# Altium footprint library 1MaxPcb.PcbLib: 187 footprints (part 2 of 12)
Each footprint in its own frame and in the unit in brackets; x right, y up, seen from the top. Pads: shape width x height; smd on the part's side, far side on the other; paste and mask are expansions set on the pad; w line width, h text height; cw(c..) or ccw(c..) is an arc to the next point about the centre after c.
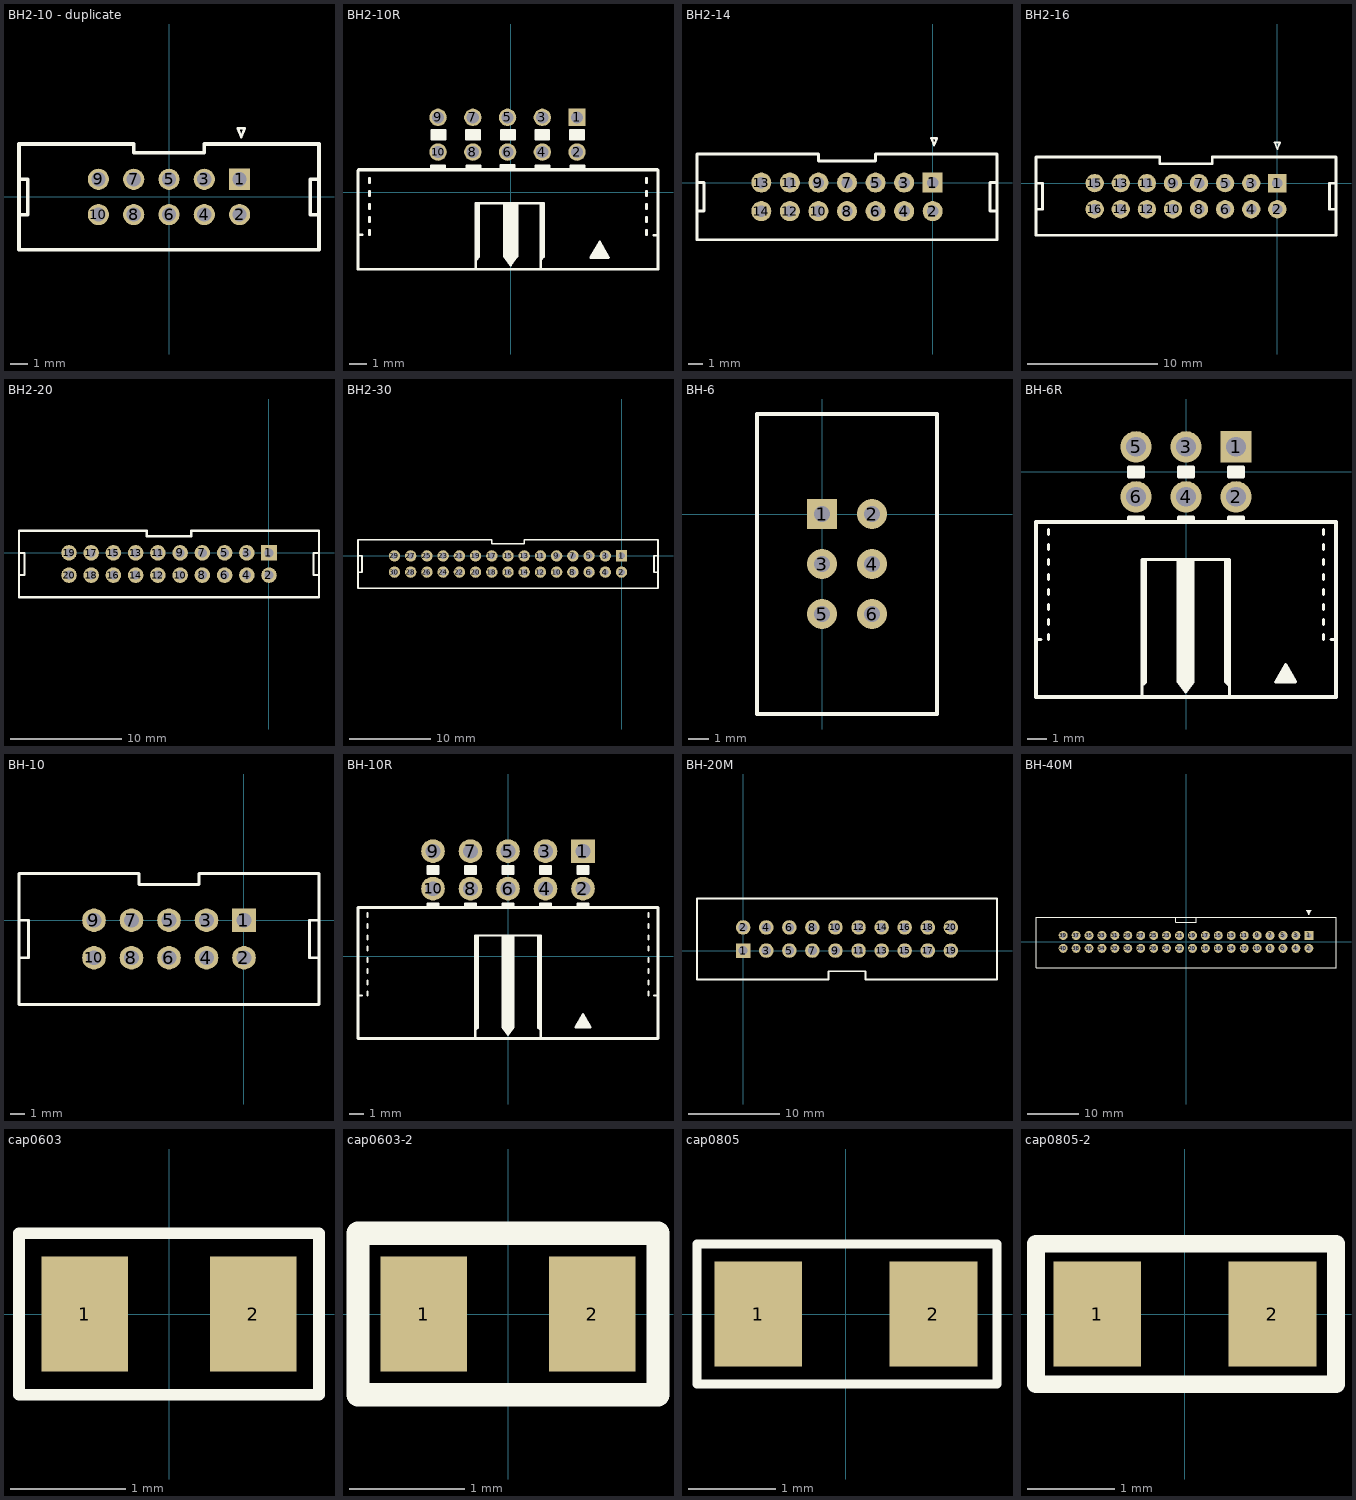
[diagram p1: the footprints below, top view; thin cyan lines are the x and y axes]

## BH2-10 - duplicate [mm]
pads (10):
  rect 1.2x1.2 hole 0.8: 1(4,1)
  round 1.2 hole 0.8: 2(4,-1) 3(2,1) 4(2,-1) 5(0,1) 6(0,-1) 7(-2,1) 8(-2,-1) 9(-4,1) 10(-4,-1)
Top Overlay:
  lines w0.15: 3.9,3.9 4.3,3.9 4.1,3.4 3.9,3.9
  lines w0.2: -8.5,-1 -8,-1 -8,1 -8.5,1 ; 8.5,-1 8,-1 8,1 8.5,1 ; -8.5,-3 8.5,-3 8.5,3 2,3 2,2.5 -2,2.5 -2,3 -8.5,3 -8.5,-3

## BH2-10R [mm]
height 6
pads (10):
  rect 1x1 hole 0.7: 1(3.81,4.318)
  round 1 hole 0.7: 2(3.81,2.318) 3(1.81,4.318) 4(1.81,2.318) 5(-0.19,4.318) 6(-0.19,2.318) 7(-2.19,4.318) 8(-2.19,2.318) 9(-4.19,4.318) 10(-4.19,2.318)
Top Overlay:
  region: 5.623,-3.75 5.115,-2.861 4.607,-3.75
  lines w0.15: -8.8,-4.432 -8.8,1.258 ; -8.8,-2.441 -8.546,-2.441 ; -8.79,-4.432 0.085,-4.432 ; -8.14,-2.432 -8.14,-2.178 ; -8.14,-1.686 -8.14,-1.432 ; -8.14,-0.936 -8.14,-0.682 ; -8.14,-0.186 -8.14,0.068 ; -8.14,0.564 -8.14,0.818 ; -4.576,1.278 -4.576,1.532 -3.814,1.532 -3.814,1.278 ; -4.449,1.278 -4.449,1.532 ; -4.424,3.064 -4.424,3.572 ; -4.322,1.278 -4.322,1.532 ; -4.297,3.064 -4.297,3.572 ; -4.195,1.278 -4.195,1.532 ; -4.17,3.064 -4.17,3.572 ; -4.068,1.278 -4.068,1.532 ; -4.043,3.064 -4.043,3.572 ; -3.941,1.278 -3.941,1.532 ; -3.916,3.064 -3.916,3.572 ; -2.536,1.278 -2.536,1.532 -1.774,1.532 -1.774,1.278 ; -2.434,3.064 -2.434,3.572 ; -2.409,1.278 -2.409,1.532 ; -2.307,3.064 -2.307,3.572 ; -2.282,1.278 -2.282,1.532 ; -2.18,3.064 -2.18,3.572 ; -2.155,1.278 -2.155,1.532 ; -2.053,3.064 -2.053,3.572 ; -2.028,1.278 -2.028,1.532 ; -2.015,-0.627 1.885,-0.627 ; -2.013,-4.432 -2.013,-0.652 -1.94,-0.725 -1.94,-3.707 ; -1.99,-3.857 -1.84,-3.707 -1.84,-0.652 ; -1.926,3.064 -1.926,3.572 ; -1.901,1.278 -1.901,1.532 ; -0.571,1.303 -0.571,1.557 0.191,1.557 0.191,1.303 ; -0.444,1.303 -0.444,1.557 ; -0.419,3.064 -0.419,3.572 ; -0.39,-0.657 -0.39,-3.683 -0.015,-4.183 ; -0.317,1.303 -0.317,1.557 ; -0.292,3.064 -0.292,3.572 ; -0.268,-3.832 -0.265,-0.657 ; -0.19,1.303 -0.19,1.557 ; -0.165,3.064 -0.165,3.572 ; -0.142,-3.929 -0.142,-0.657 ; -0.063,1.303 -0.063,1.557 ; -0.038,3.064 -0.038,3.572 ; -0.015,-4.432 8.46,-4.432 ; -0.015,-0.657 -0.015,-4.183 ; 0.064,1.303 0.064,1.557 ; 0.089,3.064 0.089,3.572 ; 0.112,-3.929 0.112,-0.657 ; 0.239,-3.802 0.239,-0.657 ; 0.36,-0.657 0.36,-3.683 -0.015,-4.183 ; 1.444,1.278 1.444,1.532 2.206,1.532 2.206,1.278 ; 1.556,3.064 1.556,3.572 ; 1.571,1.278 1.571,1.532 ; 1.683,3.064 1.683,3.572 ; 1.698,1.278 1.698,1.532 ; 1.713,-4.432 1.713,-0.652 1.785,-0.724 1.785,-3.707 ; 1.735,-3.857 1.885,-3.707 1.885,-0.652 ; 1.81,3.064 1.81,3.572 ; 1.825,1.278 1.825,1.532 ; 1.937,3.064 1.937,3.572 ; 1.952,1.278 1.952,1.532 ; 2.064,3.064 2.064,3.572 ; 2.079,1.278 2.079,1.532 ; 3.459,1.278 3.459,1.532 4.221,1.532 4.221,1.278 ; 3.556,3.064 3.556,3.572 ; 3.586,1.278 3.586,1.532 ; 3.683,3.064 3.683,3.572 ; 3.713,1.278 3.713,1.532 ; 3.81,3.064 3.81,3.572 ; 3.84,1.278 3.84,1.532 ; 3.937,3.064 3.937,3.572 ; 3.967,1.278 3.967,1.532 ; 4.064,3.064 4.064,3.572 ; 4.094,1.278 4.094,1.532 ; 7.81,-2.432 7.81,-2.178 ; 7.81,-1.686 7.81,-1.432 ; 7.81,-0.936 7.81,-0.682 ; 7.81,-0.186 7.81,0.068 ; 7.81,0.564 7.81,0.818 ; 8.216,-2.466 8.47,-2.466 ; 8.47,-4.432 8.47,1.278 ; -4.551,3.064 -3.789,3.064 -3.789,3.572 -4.551,3.572 -4.551,3.064 ; -2.561,3.064 -2.561,3.572 -1.799,3.572 -1.799,3.064 -2.561,3.064 ; -0.546,3.064 0.216,3.064 0.216,3.572 -0.546,3.572 -0.546,3.064 ; 1.429,3.064 1.429,3.572 2.191,3.572 2.191,3.064 1.429,3.064 ; 3.429,3.064 3.429,3.572 4.191,3.572 4.191,3.064 3.429,3.064 ; 4.607,-3.75 5.623,-3.75 5.115,-2.861 4.607,-3.75
  lines w0.2: -8.765,1.293 8.435,1.293

## BH2-14 [mm]
pads (14):
  rect 1.4x1.4 hole 0.8: 1(0,0)
  round 1.4 hole 0.8: 2(0,-2) 3(-2,0) 4(-2,-2) 5(-4,0) 6(-4,-2) 7(-6,0) 8(-6,-2) 9(-8,0) 10(-8,-2) 11(-10,0) 12(-10,-2) 13(-12,0) 14(-12,-2)
Top Overlay:
  lines w0.15: -0.1,3.1 0.1,2.6 0.3,3.1 -0.1,3.1
  lines w0.2: -16.5,-2 -16,-2 -16,0 -16.5,0 ; 4.5,-2 4,-2 4,0 4.5,0 ; -16.5,-4 4.5,-4 4.5,2 -4,2 -4,1.5 -8,1.5 -8,2 -16.5,2 -16.5,-4

## BH2-16 [mm]
pads (16):
  rect 1.4x1.4 hole 0.8: 1(0,0)
  round 1.4 hole 0.8: 2(0,-2) 3(-2,0) 4(-2,-2) 5(-4,0) 6(-4,-2) 7(-6,0) 8(-6,-2) 9(-8,0) 10(-8,-2) 11(-10,0) 12(-10,-2) 13(-12,0) 14(-12,-2) 15(-14,0) 16(-14,-2)
Top Overlay:
  lines w0.15: -0.2,3.1 0.2,3.1 0,2.6 -0.2,3.1
  lines w0.2: -18.5,-2 -18,-2 -18,0 -18.5,0 ; 4.5,-2 4,-2 4,0 4.5,0 ; -18.5,-4 -18.5,2 -9,2 -9,1.5 -5,1.5 -5,2 4.5,2 4.5,-4 -18.5,-4

## BH2-20 [mm]
pads (20):
  rect 1.4x1.4 hole 0.8: 1(0,0)
  round 1.4 hole 0.8: 2(0,-2) 3(-2,0) 4(-2,-2) 5(-4,0) 6(-4,-2) 7(-6,0) 8(-6,-2) 9(-8,0) 10(-8,-2) 11(-10,0) 12(-10,-2) 13(-12,0) 14(-12,-2) 15(-14,0) 16(-14,-2) 17(-16,0) 18(-16,-2) 19(-18,0) 20(-18,-2)
Top Overlay:
  lines w0.2: -22.5,-2 -22,-2 -22,0 -22.5,0 ; 4.5,-2 4,-2 4,0 4.5,0 ; -22.5,-4 4.5,-4 4.5,2 -7,2 -7,1.5 -11,1.5 -11,2 -22.5,2 -22.5,-4
Internal Plane 5:
  lines w0.178: -22.5,-2 -22,-2 -22,0 -22.5,0 ; 4.5,-2 4,-2 4,0 4.5,0 ; -22.5,-4 4.5,-4 4.5,2 -7,2 -7,1.5 -11,1.5 -11,2 -22.5,2 -22.5,-4
3D body "BH2-20.step": height 5.65, standoff -3.6, extent -22.5,-3.725 4.5,1.725

## BH2-30 [mm]
pads (30):
  rect 1.4x1.4 hole 0.8: 1(0,0)
  round 1.4 hole 0.8: 2(0,-2) 3(-2,0) 4(-2,-2) 5(-4,0) 6(-4,-2) 7(-6,0) 8(-6,-2) 9(-8,0) 10(-8,-2) 11(-10,0) 12(-10,-2) 13(-12,0) 14(-12,-2) 15(-14,0) 16(-14,-2) 17(-16,0) 18(-16,-2) 19(-18,0) 20(-18,-2) 21(-20,0) 22(-20,-2) 23(-22,0) 24(-22,-2) 25(-24,0) 26(-24,-2) 27(-26,0) 28(-26,-2) 29(-28,0) 30(-28,-2)
Top Overlay:
  lines w0.2: -32.5,-2 -32,-2 -32,0 -32.5,0 ; 4.5,-2 4,-2 4,0 4.5,0 ; -32.5,-4 4.5,-4 4.5,2 -12,2 -12,1.5 -16,1.5 -16,2 -32.5,2 -32.5,-4

## BH-6 [mm]
pads (6):
  rect 1.5x1.5 hole 0.8: 1(0,0)
  round 1.5 hole 0.8: 2(2.5,0) 3(0,-2.5) 4(2.5,-2.5) 5(0,-5) 6(2.5,-5)
Top Overlay:
  lines w0.2: -3.25,-10 5.75,-10 5.75,3.75 5.75,5 4.5,5 1.25,5 -3.25,5 -3.25,-10

## BH-6R [mm]
height 9
pads (6):
  rect 1.6x1.6 hole 1: 1(2.54,1.27)
  round 1.6 hole 1: 2(2.54,-1.27) 3(0,1.27) 4(0,-1.27) 5(-2.54,1.27) 6(-2.54,-1.27)
Top Overlay:
  region: 5.573,-10.668 5.065,-9.779 4.557,-10.668
  lines w0.15: -7.62,-8.509 -7.366,-8.509 ; -6.985,-8.509 -6.985,-8.255 ; -6.985,-7.747 -6.985,-7.493 ; -6.985,-6.985 -6.985,-6.731 ; -6.985,-6.223 -6.985,-5.969 ; -6.985,-5.461 -6.985,-5.207 ; -6.985,-4.699 -6.985,-4.445 ; -6.985,-3.937 -6.985,-3.683 ; -6.985,-3.175 -6.985,-2.921 ; -2.921,-2.54 -2.921,-2.286 -2.159,-2.286 -2.159,-2.54 ; -2.794,-2.54 -2.794,-2.286 ; -2.794,-0.254 -2.794,0.254 ; -2.667,-2.54 -2.667,-2.286 ; -2.667,-0.254 -2.667,0.254 ; -2.54,-2.54 -2.54,-2.286 ; -2.54,-0.254 -2.54,0.254 ; -2.413,-2.54 -2.413,-2.286 ; -2.413,-0.254 -2.413,0.254 ; -2.286,-2.54 -2.286,-2.286 ; -2.286,-0.254 -2.286,0.254 ; -2.238,-11.43 -2.238,-4.445 2.207,-4.445 2.207,-11.43 ; -2.174,-10.795 -2.047,-10.668 -2.047,-4.445 ; -2.174,-10.668 -2.174,-4.445 ; -0.396,-4.445 -0.396,-10.668 -0.015,-11.176 ; -0.381,-2.54 -0.381,-2.286 0.381,-2.286 0.381,-2.54 ; -0.269,-10.795 -0.269,-4.445 ; -0.254,-2.54 -0.254,-2.286 ; -0.254,-0.254 -0.254,0.254 ; -0.142,-10.922 -0.142,-4.445 ; -0.127,-2.54 -0.127,-2.286 ; -0.127,-0.254 -0.127,0.254 ; -0.015,-4.445 -0.015,-11.176 ; 0,-2.54 0,-2.286 ; 0,-0.254 0,0.254 ; 0.112,-10.922 0.112,-4.445 ; 0.127,-2.54 0.127,-2.286 ; 0.127,-0.254 0.127,0.254 ; 0.239,-10.795 0.239,-4.445 ; 0.254,-2.54 0.254,-2.286 ; 0.254,-0.254 0.254,0.254 ; 0.366,-4.445 0.366,-10.668 -0.015,-11.176 ; 2.017,-4.445 2.017,-10.668 2.144,-10.795 ; 2.144,-10.668 2.144,-4.445 ; 2.159,-2.54 2.159,-2.286 2.921,-2.286 2.921,-2.54 ; 2.286,-2.54 2.286,-2.286 ; 2.286,-0.254 2.286,0.254 ; 2.413,-2.54 2.413,-2.286 ; 2.413,-0.254 2.413,0.254 ; 2.54,-2.54 2.54,-2.286 ; 2.54,-0.254 2.54,0.254 ; 2.667,-2.54 2.667,-2.286 ; 2.667,-0.254 2.667,0.254 ; 2.794,-2.54 2.794,-2.286 ; 2.794,-0.254 2.794,0.254 ; 6.985,-8.509 6.985,-8.255 ; 6.985,-7.747 6.985,-7.493 ; 6.985,-6.985 6.985,-6.731 ; 6.985,-6.223 6.985,-5.969 ; 6.985,-5.461 6.985,-5.207 ; 6.985,-4.699 6.985,-4.445 ; 6.985,-3.937 6.985,-3.683 ; 6.985,-3.175 6.985,-2.921 ; 7.366,-8.509 7.62,-8.509 ; -2.921,-0.254 -2.921,0.254 -2.159,0.254 -2.159,-0.254 -2.921,-0.254 ; -0.381,-0.254 0.381,-0.254 0.381,0.254 -0.381,0.254 -0.381,-0.254 ; 2.159,-0.254 2.921,-0.254 2.921,0.254 2.159,0.254 2.159,-0.254 ; 4.557,-10.668 5.573,-10.668 5.065,-9.779 4.557,-10.668
  lines w0.2: -7.62,-11.43 -7.62,-2.54 7.62,-2.54 7.62,-11.43 2.207,-11.43 -2.238,-11.43 -7.62,-11.43
3D body "BH-6R.step": height 8.98, standoff -2.37, extent -7.935,-11.48 7.925,2.08

## BH-10 [mm]
height 9
pads (10):
  rect 1.6x1.6 hole 1: 1(0,0)
  round 1.6 hole 1: 2(0,-2.54) 3(-2.54,0) 4(-2.54,-2.54) 5(-5.08,0) 6(-5.08,-2.54) 7(-7.62,0) 8(-7.62,-2.54) 9(-10.16,0) 10(-10.16,-2.54)
Top Overlay:
  lines w0.2: -15.24,-2.54 -14.605,-2.54 -14.605,0 -15.24,0 ; 5.08,-2.54 4.445,-2.54 4.445,0 5.08,0 ; -15.24,-5.715 5.08,-5.715 5.08,3.175 -3.048,3.175 -3.048,2.413 -7.112,2.413 -7.112,3.175 -15.24,3.175 -15.24,-5.715
3D body "User Library-BH-10.STEP": height 9.2, standoff -2.9, extent -15.33,-6.02 5.17,3.28

## BH-10R [mm]
height 9
pads (10):
  rect 1.6x1.6 hole 1: 1(5.08,7.112)
  round 1.6 hole 1: 2(5.08,4.572) 3(2.54,7.112) 4(2.54,4.572) 5(0,7.112) 6(0,4.572) 7(-2.54,7.112) 8(-2.54,4.572) 9(-5.08,7.112) 10(-5.08,4.572)
Top Overlay:
  region: 5.588,-4.826 5.08,-3.937 4.572,-4.826
  lines w0.15: -10.16,-2.667 -9.906,-2.667 ; -9.525,-2.667 -9.525,-2.413 ; -9.525,-1.905 -9.525,-1.651 ; -9.525,-1.143 -9.525,-0.889 ; -9.525,-0.381 -9.525,-0.127 ; -9.525,0.381 -9.525,0.635 ; -9.525,1.143 -9.525,1.397 ; -9.525,1.905 -9.525,2.159 ; -9.525,2.667 -9.525,2.921 ; -5.461,3.302 -5.461,3.556 -4.699,3.556 -4.699,3.302 ; -5.334,3.302 -5.334,3.556 ; -5.334,5.588 -5.334,6.096 ; -5.207,3.302 -5.207,3.556 ; -5.207,5.588 -5.207,6.096 ; -5.08,3.302 -5.08,3.556 ; -5.08,5.588 -5.08,6.096 ; -4.953,3.302 -4.953,3.556 ; -4.953,5.588 -4.953,6.096 ; -4.826,3.302 -4.826,3.556 ; -4.826,5.588 -4.826,6.096 ; -2.921,3.302 -2.921,3.556 -2.159,3.556 -2.159,3.302 ; -2.794,3.302 -2.794,3.556 ; -2.794,5.588 -2.794,6.096 ; -2.667,3.302 -2.667,3.556 ; -2.667,5.588 -2.667,6.096 ; -2.54,3.302 -2.54,3.556 ; -2.54,5.588 -2.54,6.096 ; -2.413,3.302 -2.413,3.556 ; -2.413,5.588 -2.413,6.096 ; -2.286,3.302 -2.286,3.556 ; -2.286,5.588 -2.286,6.096 ; -2.222,-5.588 -2.222,1.397 2.222,1.397 2.222,-5.588 ; -2.159,-4.953 -2.032,-4.826 -2.032,1.397 ; -2.159,-4.826 -2.159,1.397 ; -0.381,1.397 -0.381,-4.826 0,-5.334 ; -0.381,3.302 -0.381,3.556 0.381,3.556 0.381,3.302 ; -0.254,-4.953 -0.254,1.397 ; -0.254,3.302 -0.254,3.556 ; -0.254,5.588 -0.254,6.096 ; -0.127,-5.08 -0.127,1.397 ; -0.127,3.302 -0.127,3.556 ; -0.127,5.588 -0.127,6.096 ; 0,1.397 0,-5.334 ; 0,3.302 0,3.556 ; 0,5.588 0,6.096 ; 0.127,-5.08 0.127,1.397 ; 0.127,3.302 0.127,3.556 ; 0.127,5.588 0.127,6.096 ; 0.254,-4.953 0.254,1.397 ; 0.254,3.302 0.254,3.556 ; 0.254,5.588 0.254,6.096 ; 0.381,1.397 0.381,-4.826 0,-5.334 ; 2.032,1.397 2.032,-4.826 2.159,-4.953 ; 2.159,-4.826 2.159,1.397 ; 2.159,3.302 2.159,3.556 2.921,3.556 2.921,3.302 ; 2.286,3.302 2.286,3.556 ; 2.286,5.588 2.286,6.096 ; 2.413,3.302 2.413,3.556 ; 2.413,5.588 2.413,6.096 ; 2.54,3.302 2.54,3.556 ; 2.54,5.588 2.54,6.096 ; 2.667,3.302 2.667,3.556 ; 2.667,5.588 2.667,6.096 ; 2.794,3.302 2.794,3.556 ; 2.794,5.588 2.794,6.096 ; 4.699,3.302 4.699,3.556 5.461,3.556 5.461,3.302 ; 4.826,3.302 4.826,3.556 ; 4.826,5.588 4.826,6.096 ; 4.953,3.302 4.953,3.556 ; 4.953,5.588 4.953,6.096 ; 5.08,3.302 5.08,3.556 ; 5.08,5.588 5.08,6.096 ; 5.207,3.302 5.207,3.556 ; 5.207,5.588 5.207,6.096 ; 5.334,3.302 5.334,3.556 ; 5.334,5.588 5.334,6.096 ; 9.525,-2.667 9.525,-2.413 ; 9.525,-1.905 9.525,-1.651 ; 9.525,-1.143 9.525,-0.889 ; 9.525,-0.381 9.525,-0.127 ; 9.525,0.381 9.525,0.635 ; 9.525,1.143 9.525,1.397 ; 9.525,1.905 9.525,2.159 ; 9.525,2.667 9.525,2.921 ; 9.906,-2.667 10.16,-2.667 ; -5.461,5.588 -4.699,5.588 -4.699,6.096 -5.461,6.096 -5.461,5.588 ; -2.921,5.588 -2.159,5.588 -2.159,6.096 -2.921,6.096 -2.921,5.588 ; -0.381,5.588 -0.381,6.096 0.381,6.096 0.381,5.588 -0.381,5.588 ; 2.159,5.588 2.921,5.588 2.921,6.096 2.159,6.096 2.159,5.588 ; 4.572,-4.826 5.588,-4.826 5.08,-3.937 4.572,-4.826 ; 4.699,5.588 5.461,5.588 5.461,6.096 4.699,6.096 4.699,5.588
  lines w0.2: -10.16,-5.588 -10.16,3.302 10.16,3.302 10.16,-5.588 2.222,-5.588 -2.222,-5.588 -10.16,-5.588
3D body "BH-10R.step": height 6.98, standoff -4.37, extent -10.37,-6.1 10.57,7.46

## BH-20M [mm] "Contact spacing 2,54 mm"
height 9
pads (20):
  rect 1.6x1.6 hole 1: 1(0,0)
  round 1.6 hole 1: 2(0,2.54) 3(2.54,0) 4(2.54,2.54) 5(5.08,0) 6(5.08,2.54) 7(7.62,0) 8(7.62,2.54) 9(10.16,0) 10(10.16,2.54) 11(12.7,0) 12(12.7,2.54) 13(15.24,0) 14(15.24,2.54) 15(17.78,0) 16(17.78,2.54) 17(20.32,0) 18(20.32,2.54) 19(22.86,0) 20(22.86,2.54)
Top Overlay:
  lines w0.2: -5.08,-3.175 9.398,-3.175 9.398,-2.286 13.462,-2.286 13.462,-3.175 27.94,-3.175 27.94,5.715 -5.08,5.715 -5.08,-3.175
3D body "User Library-BH-20.step": height 9.2, standoff -2.9, extent -5.17,-3.28 28.03,6.02

## BH-40M [mm]
pads (40):
  rect 1.75x1.75 hole 1: 1(24.13,1.27)
  round 1.75 hole 1: 2(24.13,-1.27) 3(21.59,1.27) 4(21.59,-1.27) 5(19.05,1.27) 6(19.05,-1.27) 7(16.51,1.27) 8(16.51,-1.27) 9(13.97,1.27) 10(13.97,-1.27) 11(11.43,1.27) 12(11.43,-1.27) 13(8.89,1.27) 14(8.89,-1.27) 15(6.35,1.27) 16(6.35,-1.27) 17(3.81,1.27) 18(3.81,-1.27) 19(1.27,1.27) 20(1.27,-1.27) 21(-1.27,1.27) 22(-1.27,-1.27) 23(-3.81,1.27) 24(-3.81,-1.27) 25(-6.35,1.27) 26(-6.35,-1.27) 27(-8.89,1.27) 28(-8.89,-1.27) 29(-11.43,1.27) 30(-11.43,-1.27) 31(-13.97,1.27) 32(-13.97,-1.27) 33(-16.51,1.27) 34(-16.51,-1.27) 35(-19.05,1.27) 36(-19.05,-1.27) 37(-21.59,1.27) 38(-21.59,-1.27) 39(-24.13,1.27) 40(-24.13,-1.27)
Top Overlay:
  region: 23.622,6.223 24.13,5.334 24.638,6.223
  lines w0.15: 23.622,6.223 24.13,5.334 24.638,6.223 23.622,6.223
  lines w0.2: -2.032,4.826 -2.032,3.826 2.032,3.826 2.032,4.826 ; -29.464,-5.08 29.464,-5.08 29.464,4.826 -29.464,4.826 -29.464,-5.08
3D body "BH-40.STEP": height 9.2, standoff -2.9, extent -29.3,-4.728 29.3,4.572

## cap0603 [mm]
height 0.45
pads (2):
  rect 0.75x1 smd mask+0.03: 1(-0.73,0) 2(0.73,0)
Top Overlay:
  lines w0.1: -1.3,-0.7 -1.3,0.7 1.3,0.7 1.3,-0.7 -1.3,-0.7
3D body "cap0603.STEP": height 0.8, standoff 0, extent -0.8,-0.4 0.8,0.4

## cap0603-2 [mm]
height 0.45
pads (2):
  rect 0.75x1 smd mask+0.03: 1(-0.73,0) 2(0.73,0)
Top Overlay:
  lines w0.2: -1.3,-0.7 -1.3,0.7 1.3,0.7 1.3,-0.7 -1.3,-0.7
3D body "cap0603.STEP": height 0.8, standoff 0, extent -0.8,-0.4 0.8,0.4

## cap0805 [mm]
height 0.5
pads (2):
  rect 1x1.2 smd mask+0.03: 1(-1,0) 2(1,0)
Top Overlay:
  lines w0.1: -1.7,-0.8 1.725,-0.8 1.725,0.8 -1.7,0.8 -1.7,-0.8
3D body "cap0805.STEP": height 0.6, standoff 0, extent -1,-0.625 1,0.625

## cap0805-2 [mm]
height 0.5
pads (2):
  rect 1x1.2 smd mask+0.03: 1(-1,0) 2(1,0)
Top Overlay:
  lines w0.2: -1.7,-0.8 1.725,-0.8 1.725,0.8 -1.7,0.8 -1.7,-0.8
3D body "cap0805.STEP": height 0.6, standoff 0, extent -1,-0.625 1,0.625